# Altium footprint library Package_DFN_QFN.PcbLib: 557 footprints (part 4 of 35)
Each footprint in its own frame and in the unit in brackets; x right, y up, seen from the top. Pads: shape width x height; smd on the part's side, far side on the other; paste and mask are expansions set on the pad; w line width, h text height; cw(c..) or ccw(c..) is an arc to the next point about the centre after c.
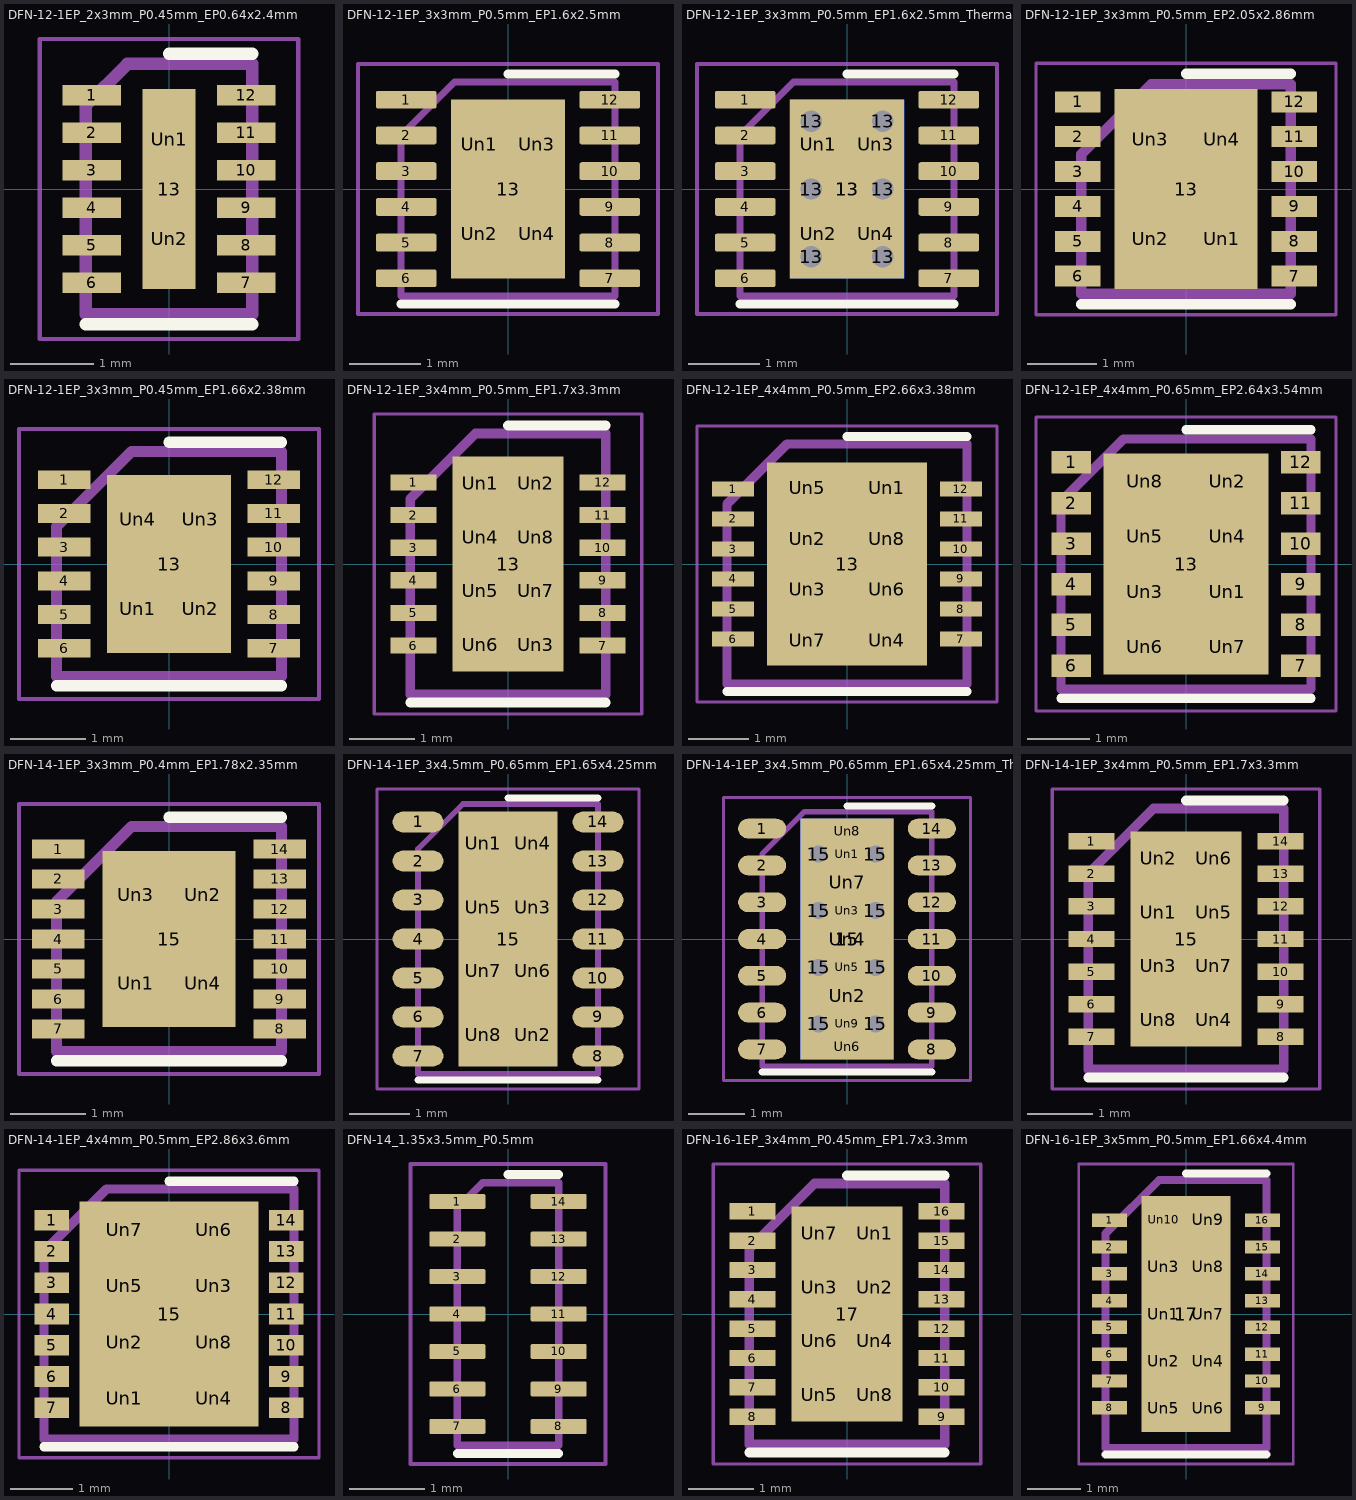
[diagram p3: the footprints below, top view; thin cyan lines are the x and y axes]

## DFN-12-1EP_2x3mm_P0.45mm_EP0.64x2.4mm [mm]
pads (15):
  rect 0.7x0.25 smd: 1(-0.925,1.125) 2(-0.925,0.675) 3(-0.925,0.225) 4(-0.925,-0.225) 5(-0.925,-0.675) 6(-0.925,-1.125) 7(0.925,-1.125) 8(0.925,-0.675) 9(0.925,-0.225) 10(0.925,0.225) 11(0.925,0.675) 12(0.925,1.125)
  rect 0.64x2.4 smd: 13(0,0)
  rect 0.5x1 on Top Paste: Un1(0,0.6) Un2(0,-0.6)
F.SilkS:
  lines w0.15: -1,-1.625 1,-1.625 ; 0,1.625 1,1.625
F.CrtYd:
  lines w0.05: -1.55,-1.8 -1.55,1.8 1.55,1.8 1.55,-1.8 -1.55,-1.8
F.Fab:
  lines w0.15: -1,-1.5 -1,1 -0.5,1.5 1,1.5 1,-1.5 -1,-1.5
  text "'.Designator'" at -2.023,-0.42 h0.5

## DFN-12-1EP_3x3mm_P0.5mm_EP1.6x2.5mm [mm]
pads (17):
  rrect25% 0.85x0.25 smd: 1(-1.425,1.25) 2(-1.425,0.75) 3(-1.425,0.25) 4(-1.425,-0.25) 5(-1.425,-0.75) 6(-1.425,-1.25) 7(1.425,-1.25) 8(1.425,-0.75) 9(1.425,-0.25) 10(1.425,0.25) 11(1.425,0.75) 12(1.425,1.25)
  rect 1.6x2.5 smd: 13(0,0)
  rrect25% 0.64x1.01 on Top Paste: Un1(-0.4,0.625) Un2(-0.4,-0.625) Un3(0.4,0.625) Un4(0.4,-0.625)
F.SilkS:
  lines w0.12: -1.5,-1.61 1.5,-1.61 ; 0,1.61 1.5,1.61
F.CrtYd:
  lines w0.05: -2.1,-1.75 -2.1,1.75 2.1,1.75 2.1,-1.75 -2.1,-1.75
F.Fab:
  lines w0.1: -1.5,-1.5 1.5,-1.5 1.5,1.5 -0.75,1.5 -1.5,0.75 -1.5,-1.5
  text "'.Designator'" at -3.033,-0.628 h0.75

## DFN-12-1EP_3x3mm_P0.5mm_EP1.6x2.5mm_ThermalVias [mm]
pads (24):
  rrect25% 0.85x0.25 smd: 1(-1.425,1.25) 2(-1.425,0.75) 3(-1.425,0.25) 4(-1.425,-0.25) 5(-1.425,-0.75) 6(-1.425,-1.25) 7(1.425,-1.25) 8(1.425,-0.75) 9(1.425,-0.25) 10(1.425,0.25) 11(1.425,0.75) 12(1.425,1.25)
  round 0.6 hole 0.3: 13(-0.5,-0.95) 13(-0.5,0) 13(-0.5,0.95) 13(0.5,-0.95) 13(0.5,0) 13(0.5,0.95)
  rect 1.6x2.5 smd: 13(0,0)
  rect 1.6x2.5 smd far side: 13(0,0)
  rrect25% 0.64x1.01 on Top Paste: Un1(-0.4,0.625) Un2(-0.4,-0.625) Un3(0.4,0.625) Un4(0.4,-0.625)
F.SilkS:
  lines w0.12: -1.5,-1.61 1.5,-1.61 ; 0,1.61 1.5,1.61
F.CrtYd:
  lines w0.05: -2.1,-1.75 -2.1,1.75 2.1,1.75 2.1,-1.75 -2.1,-1.75
F.Fab:
  lines w0.1: -1.5,-1.5 1.5,-1.5 1.5,1.5 -0.75,1.5 -1.5,0.75 -1.5,-1.5
  text "'.Designator'" at -3.033,-0.628 h0.75

## DFN-12-1EP_3x3mm_P0.5mm_EP2.05x2.86mm [mm]
pads (17):
  rect 0.65x0.3 smd: 1(-1.55,1.25) 2(-1.55,0.75) 3(-1.55,0.25) 4(-1.55,-0.25) 5(-1.55,-0.75) 6(-1.55,-1.25) 7(1.55,-1.25) 8(1.55,-0.75) 9(1.55,-0.25) 10(1.55,0.25) 11(1.55,0.75) 12(1.55,1.25)
  rect 2.05x2.86 smd: 13(0,0)
  rect 0.8x1.2 on Top Paste: Un1(0.513,-0.715) Un2(-0.513,-0.715) Un3(-0.513,0.715) Un4(0.513,0.715)
F.SilkS:
  lines w0.15: -1.5,-1.65 1.5,-1.65 ; 0,1.65 1.5,1.65
F.CrtYd:
  lines w0.05: -2.15,-1.8 2.15,-1.8 2.15,1.8 -2.15,1.8 -2.15,-1.8
F.Fab:
  lines w0.15: -1.5,-1.5 -1.5,0.5 -0.5,1.5 1.5,1.5 1.5,-1.5 -1.5,-1.5
  text "'.Designator'" at -2.833,-0.588 h0.7

## DFN-12-1EP_3x3mm_P0.45mm_EP1.66x2.38mm [mm]
pads (17):
  rect 0.7x0.25 smd: 1(-1.4,1.125) 2(-1.4,0.675) 3(-1.4,0.225) 4(-1.4,-0.225) 5(-1.4,-0.675) 6(-1.4,-1.125) 7(1.4,-1.125) 8(1.4,-0.675) 9(1.4,-0.225) 10(1.4,0.225) 11(1.4,0.675) 12(1.4,1.125)
  rect 1.66x2.38 smd: 13(0,0)
  rect 0.64x1 on Top Paste: Un1(-0.415,-0.595) Un2(0.415,-0.595) Un3(0.415,0.595) Un4(-0.415,0.595)
F.SilkS:
  lines w0.15: -1.5,-1.625 1.5,-1.625 ; 0,1.625 1.5,1.625
F.CrtYd:
  lines w0.05: -2,-1.8 2,-1.8 2,1.8 -2,1.8 -2,-1.8
F.Fab:
  lines w0.15: -1.5,-1.5 -1.5,0.5 -0.5,1.5 1.5,1.5 1.5,-1.5 -1.5,-1.5
  text "'.Designator'" at -2.833,-0.588 h0.7

## DFN-12-1EP_3x4mm_P0.5mm_EP1.7x3.3mm [mm]
pads (21):
  rect 0.7x0.25 smd: 1(-1.45,1.25) 2(-1.45,0.75) 3(-1.45,0.25) 4(-1.45,-0.25) 5(-1.45,-0.75) 6(-1.45,-1.25) 7(1.45,-1.25) 8(1.45,-0.75) 9(1.45,-0.25) 10(1.45,0.25) 11(1.45,0.75) 12(1.45,1.25)
  rect 1.7x3.3 smd: 13(0,0)
  rect 0.685x0.67 on Top Paste: Un1(-0.425,1.238) Un2(0.425,1.238) Un3(0.425,-1.238) Un4(-0.425,0.413) Un5(-0.425,-0.413) Un6(-0.425,-1.238) Un7(0.425,-0.413) Un8(0.425,0.413)
F.SilkS:
  lines w0.15: -1.5,-2.125 1.5,-2.125 ; 0,2.125 1.5,2.125
F.CrtYd:
  lines w0.05: -2.05,-2.3 -2.05,2.3 2.05,2.3 2.05,-2.3 -2.05,-2.3
F.Fab:
  lines w0.15: -1.5,-2 1.5,-2 1.5,2 -0.5,2 -1.5,1 -1.5,-2
  text "'.Designator'" at -2.833,-0.588 h0.7

## DFN-12-1EP_4x4mm_P0.5mm_EP2.66x3.38mm [mm]
pads (21):
  rect 0.7x0.25 smd: 1(-1.9,1.25) 2(-1.9,0.75) 3(-1.9,0.25) 4(-1.9,-0.25) 5(-1.9,-0.75) 6(-1.9,-1.25) 7(1.9,-1.25) 8(1.9,-0.75) 9(1.9,-0.25) 10(1.9,0.25) 11(1.9,0.75) 12(1.9,1.25)
  rect 2.66x3.38 smd: 13(0,0)
  rect 1.15x0.63 on Top Paste: Un1(0.665,1.268) Un2(-0.665,0.423) Un3(-0.665,-0.423) Un4(0.665,-1.268) Un5(-0.665,1.268) Un6(0.665,-0.423) Un7(-0.665,-1.268) Un8(0.665,0.423)
F.SilkS:
  lines w0.15: -2,-2.125 2,-2.125 ; 0,2.125 2,2.125
F.CrtYd:
  lines w0.05: -2.5,-2.3 2.5,-2.3 2.5,2.3 -2.5,2.3 -2.5,-2.3
F.Fab:
  lines w0.15: -2,-2 2,-2 2,2 -1,2 -2,1 -2,-2
  text "'.Designator'" at -4.047,-0.84 h1

## DFN-12-1EP_4x4mm_P0.65mm_EP2.64x3.54mm [mm]
pads (21):
  rect 0.63x0.36 smd: 1(-1.835,1.625) 2(-1.835,0.975) 3(-1.835,0.325) 4(-1.835,-0.325) 5(-1.835,-0.975) 6(-1.835,-1.625) 7(1.835,-1.625) 8(1.835,-0.975) 9(1.835,-0.325) 10(1.835,0.325) 11(1.835,0.975) 12(1.835,1.625)
  rect 2.64x3.54 smd: 13(0,0)
  rect 1.1x0.7 on Top Paste: Un1(0.66,-0.443) Un2(0.66,1.328) Un3(-0.66,-0.443) Un4(0.66,0.443) Un5(-0.66,0.443) Un6(-0.66,-1.328) Un7(0.66,-1.328) Un8(-0.66,1.328)
F.SilkS:
  lines w0.15: -2,-2.15 2,-2.15 ; 0,2.15 2,2.15
F.CrtYd:
  lines w0.05: -2.4,-2.35 -2.4,2.35 2.4,2.35 2.4,-2.35 -2.4,-2.35
F.Fab:
  lines w0.15: -2,-2 -2,1 -1,2 2,2 2,-2 -2,-2
  text "'.Designator'" at -4.047,-0.84 h1

## DFN-14-1EP_3x3mm_P0.4mm_EP1.78x2.35mm [mm]
pads (19):
  rect 0.7x0.25 smd: 1(-1.475,1.2) 2(-1.475,0.8) 3(-1.475,0.4) 4(-1.475,0) 5(-1.475,-0.4) 6(-1.475,-0.8) 7(-1.475,-1.2) 8(1.475,-1.2) 9(1.475,-0.8) 10(1.475,-0.4) 11(1.475,0) 12(1.475,0.4) 13(1.475,0.8) 14(1.475,1.2)
  rect 1.78x2.35 smd: 15(0,0)
  rect 0.7x0.97 on Top Paste: Un1(-0.445,-0.587) Un2(0.45,0.587) Un3(-0.445,0.587) Un4(0.45,-0.587)
F.SilkS:
  lines w0.15: -1.5,-1.625 1.5,-1.625 ; 0,1.625 1.5,1.625
F.CrtYd:
  lines w0.05: -2,-1.8 -2,1.8 2,1.8 2,-1.8 -2,-1.8
F.Fab:
  lines w0.15: -1.5,-1.5 1.5,-1.5 1.5,1.5 -0.5,1.5 -1.5,0.5 -1.5,-1.5
  text "'.Designator'" at -2.388,-0.689 h0.6

## DFN-14-1EP_3x4.5mm_P0.65mm_EP1.65x4.25mm [mm]
pads (23):
  rrect100% 0.85x0.35 smd: 1(-1.5,1.95) 2(-1.5,1.3) 3(-1.5,0.65) 4(-1.5,0) 5(-1.5,-0.65) 6(-1.5,-1.3) 7(-1.5,-1.95) 8(1.5,-1.95) 9(1.5,-1.3) 10(1.5,-0.65) 11(1.5,0) 12(1.5,0.65) 13(1.5,1.3) 14(1.5,1.95)
  rect 1.65x4.25 smd: 15(0,0)
  rect 0.66x0.85 on Top Paste: Un1(-0.413,1.594) Un2(0.413,-1.594) Un3(0.413,0.531) Un4(0.413,1.594) Un5(-0.413,0.531) Un6(0.413,-0.531) Un7(-0.413,-0.531) Un8(-0.413,-1.594)
F.SilkS:
  lines w0.12: -1.5,-2.35 1.5,-2.35 ; 0,2.35 1.5,2.35
F.CrtYd:
  lines w0.05: -2.18,-2.5 2.18,-2.5 2.18,2.5 -2.18,2.5 -2.18,-2.5
F.Fab:
  lines w0.1: -1.5,-2.25 -1.5,1.5 -0.75,2.25 1.5,2.25 1.5,-2.25 -1.5,-2.25
  text "'.Designator'" at -3.073,-0.668 h0.75

## DFN-14-1EP_3x4.5mm_P0.65mm_EP1.65x4.25mm_ThermalVias [mm]
pads (33):
  rrect100% 0.85x0.35 smd: 1(-1.5,1.95) 2(-1.5,1.3) 3(-1.5,0.65) 4(-1.5,0) 5(-1.5,-0.65) 6(-1.5,-1.3) 7(-1.5,-1.95) 8(1.5,-1.95) 9(1.5,-1.3) 10(1.5,-0.65) 11(1.5,0) 12(1.5,0.65) 13(1.5,1.3) 14(1.5,1.95)
  round 0.65 hole 0.3: 15(-0.5,-1.5) 15(-0.5,-0.5) 15(-0.5,0.5) 15(-0.5,1.5) 15(0.5,-1.5) 15(0.5,-0.5) 15(0.5,0.5) 15(0.5,1.5)
  rect 1.65x4.25 smd: 15(0,0)
  rect 1.65x4.25 smd far side: 15(0,0)
  rect 0.5x0.5 on Top Paste: Un1(0,1.5) Un3(0,0.5) Un5(0,-0.5) Un9(0,-1.5)
  rect 1.5x0.5 on Top Paste: Un2(0,-1) Un4(0,0) Un7(0,1)
  rect 1.5x0.3 on Top Paste: Un6(0,-1.9) Un8(0,1.9)
F.SilkS:
  lines w0.12: -1.5,-2.35 1.5,-2.35 ; 0,2.35 1.5,2.35
F.CrtYd:
  lines w0.05: -2.18,-2.5 -2.18,2.5 2.18,2.5 2.18,-2.5 -2.18,-2.5
F.Fab:
  lines w0.1: -1.5,-2.25 1.5,-2.25 1.5,2.25 -0.75,2.25 -1.5,1.5 -1.5,-2.25
  text "'.Designator'" at -3.073,-0.668 h0.75

## DFN-14-1EP_3x4mm_P0.5mm_EP1.7x3.3mm [mm]
pads (23):
  rect 0.7x0.25 smd: 1(-1.45,1.5) 2(-1.45,1) 3(-1.45,0.5) 4(-1.45,0) 5(-1.45,-0.5) 6(-1.45,-1) 7(-1.45,-1.5) 8(1.45,-1.5) 9(1.45,-1) 10(1.45,-0.5) 11(1.45,0) 12(1.45,0.5) 13(1.45,1) 14(1.45,1.5)
  rect 1.7x3.3 smd: 15(0,0)
  rect 0.685x0.67 on Top Paste: Un1(-0.425,0.413) Un2(-0.425,1.238) Un3(-0.425,-0.413) Un4(0.425,-1.238) Un5(0.425,0.413) Un6(0.425,1.238) Un7(0.425,-0.413) Un8(-0.425,-1.238)
F.SilkS:
  lines w0.15: -1.5,-2.125 1.5,-2.125 ; 0,2.125 1.5,2.125
F.CrtYd:
  lines w0.05: -2.05,-2.3 -2.05,2.3 2.05,2.3 2.05,-2.3 -2.05,-2.3
F.Fab:
  lines w0.15: -1.5,-2 -1.5,1 -0.5,2 1.5,2 1.5,-2 -1.5,-2
  text "'.Designator'" at -2.833,-0.588 h0.7

## DFN-14-1EP_4x4mm_P0.5mm_EP2.86x3.6mm [mm]
pads (23):
  rect 0.55x0.33 smd: 1(-1.875,1.5) 2(-1.875,1) 3(-1.875,0.5) 4(-1.875,0) 5(-1.875,-0.5) 6(-1.875,-1) 7(-1.875,-1.5) 8(1.875,-1.5) 9(1.875,-1) 10(1.875,-0.5) 11(1.875,0) 12(1.875,0.5) 13(1.875,1) 14(1.875,1.5)
  rect 2.86x3.6 smd: 15(0,0)
  rect 1.2x0.7 on Top Paste: Un1(-0.715,-1.35) Un2(-0.715,-0.45) Un3(0.715,0.45) Un4(0.715,-1.35) Un5(-0.715,0.45) Un6(0.715,1.35) Un7(-0.715,1.35) Un8(0.715,-0.45)
F.SilkS:
  lines w0.15: -2,-2.125 2,-2.125 ; 0,2.125 2,2.125
F.CrtYd:
  lines w0.05: -2.4,-2.3 -2.4,2.3 2.4,2.3 2.4,-2.3 -2.4,-2.3
F.Fab:
  lines w0.15: -2,-2 -2,1 -1,2 2,2 2,-2 -2,-2
  text "'.Designator'" at -4.047,-0.84 h1

## DFN-14_1.35x3.5mm_P0.5mm [mm]
pads (14):
  rrect25% 0.75x0.2 smd: 1(-0.675,1.5) 2(-0.675,1) 3(-0.675,0.5) 4(-0.675,0) 5(-0.675,-0.5) 6(-0.675,-1) 7(-0.675,-1.5) 8(0.675,-1.5) 9(0.675,-1) 10(0.675,-0.5) 11(0.675,0) 12(0.675,0.5) 13(0.675,1) 14(0.675,1.5)
F.SilkS:
  lines w0.12: -0.675,-1.86 0.675,-1.86 ; 0,1.86 0.675,1.86
F.CrtYd:
  lines w0.05: -1.3,-2 -1.3,2 1.3,2 1.3,-2 -1.3,-2
F.Fab:
  lines w0.1: -0.675,-1.75 -0.675,1.412 -0.337,1.75 0.675,1.75 0.675,-1.75 -0.675,-1.75
  text "'.Designator'" at -1.375,-0.285 h0.34

## DFN-16-1EP_3x4mm_P0.45mm_EP1.7x3.3mm [mm]
pads (25):
  rect 0.7x0.25 smd: 1(-1.45,1.575) 2(-1.45,1.125) 3(-1.45,0.675) 4(-1.45,0.225) 5(-1.45,-0.225) 6(-1.45,-0.675) 7(-1.45,-1.125) 8(-1.45,-1.575) 9(1.45,-1.575) 10(1.45,-1.125) 11(1.45,-0.675) 12(1.45,-0.225) 13(1.45,0.225) 14(1.45,0.675) 15(1.45,1.125) 16(1.45,1.575)
  rect 1.7x3.3 smd: 17(0,0)
  rect 0.685x0.67 on Top Paste: Un1(0.425,1.238) Un2(0.425,0.413) Un3(-0.425,0.413) Un4(0.425,-0.413) Un5(-0.425,-1.238) Un6(-0.425,-0.413) Un7(-0.425,1.238) Un8(0.425,-1.238)
F.SilkS:
  lines w0.15: -1.5,-2.125 1.5,-2.125 ; 0,2.125 1.5,2.125
F.CrtYd:
  lines w0.05: -2.05,-2.3 -2.05,2.3 2.05,2.3 2.05,-2.3 -2.05,-2.3
F.Fab:
  lines w0.15: -1.5,-2 -1.5,1 -0.5,2 1.5,2 1.5,-2 -1.5,-2
  text "'.Designator'" at -2.833,-0.588 h0.7

## DFN-16-1EP_3x5mm_P0.5mm_EP1.66x4.4mm [mm]
pads (27):
  rect 0.65x0.25 smd: 1(-1.425,1.75) 2(-1.425,1.25) 3(-1.425,0.75) 4(-1.425,0.25) 5(-1.425,-0.25) 6(-1.425,-0.75) 7(-1.425,-1.25) 8(-1.425,-1.75) 9(1.425,-1.75) 10(1.425,-1.25) 11(1.425,-0.75) 12(1.425,-0.25) 13(1.425,0.25) 14(1.425,0.75) 15(1.425,1.25) 16(1.425,1.75)
  rect 1.66x4.4 smd: 17(0,0)
  rect 0.67x0.71 on Top Paste: Un1(-0.415,0) Un2(-0.415,-0.88) Un3(-0.415,0.88) Un4(0.415,-0.88) Un5(-0.415,-1.76) Un6(0.415,-1.76) Un7(0.415,0) Un8(0.415,0.88) Un9(0.415,1.76) Un10(-0.415,1.76)
F.SilkS:
  lines w0.15: -1.5,-2.625 1.5,-2.625 ; 0,2.625 1.5,2.625
F.CrtYd:
  lines w0.05: -2,-2.8 -2,2.8 2,2.8 2,-2.8 -2,-2.8
F.Fab:
  lines w0.15: -1.5,-2.5 -1.5,1.5 -0.5,2.5 1.5,2.5 1.5,-2.5 -1.5,-2.5
  text "'.Designator'" at -2.833,-0.588 h0.7